# Altium schematic symbol library Diode - Rectifier.SchLib: 777 symbols (part 2 of 4) (continued)
## MURS320T3G (continued)
DIODE GEN PURP 200V 3A SMC; Manufacturer: ON Semiconductor; Type: Standard; Current Reverse Leakage @ Vr: 5uA @ 200V; Reverse Recovery Time (trr): 35ns; Voltage Forward (Vf): 875mV @ 3A; Part Number: MURS320T3G; PartId: 27688; Supplier 1: Digi-Key; Supplier Part Number 1: MURS320T3GOSCT-ND; ComponentLink1Description: Datasheet; ComponentLink1URL: http://www.onsemi.com/pub_link/Collateral/MURS320T3-D.PDF; ComponentLink2Description: Digi-Key Listing; ComponentLink2URL: https://www.digikey.com/product-detail/en/on-semiconductor/MURS320T3G/MURS320T3GOSCT-ND/964579; Junction Operating Temperature: -65C ~ 175C; Price: 0.61; Device Package: DO-214AB, SMC; Voltage DC Reverse (Vr): 200V; Current Rectified: 3A
footprint ST DO214AB SMC
pins: 1, 2

## MURS320TR
designator D?
DIODE GEN PURP 200V 3A SMC; Manufacturer: SMC Diode Solutions; Type: Standard; Current Reverse Leakage @ Vr: 5uA @ 200V; Reverse Recovery Time (trr): 35ns; Voltage Forward (Vf): 900mV @ 3A; Part Number: MURS320TR; PartId: 27814; Supplier 1: Digi-Key; Supplier Part Number 1: 1655-1493-1-ND; ComponentLink1Description: Datasheet; ComponentLink1URL: http://www.smc-diodes.com/propdf/MURS320%20N0162%20REV.A.pdf; ComponentLink2Description: Digi-Key Listing; ComponentLink2URL: https://www.digikey.com/product-detail/en/smc-diode-solutions/MURS320TR/1655-1493-1-ND/6022938; Junction Operating Temperature: -65C ~ 175C; Price: 0.43; Device Package: DO-214AB, SMC; Voltage DC Reverse (Vr): 200V; Current Rectified: 3A
footprint ST DO214AB SMC
pins: 1, 2

## MURS340-E3/57T
designator D?
DIODE GEN PURP 400V 3A DO214AB; Manufacturer: Vishay Semiconductor Diodes Division; Type: Standard; Current Reverse Leakage @ Vr: 10uA @ 400V; Reverse Recovery Time (trr): 75ns; Voltage Forward (Vf): 1.25V @ 3A; Part Number: MURS340-E3/57T; PartId: 27903; Supplier 1: Digi-Key; Supplier Part Number 1: MURS340-E3/57TGICT-ND; ComponentLink1Description: Datasheet; ComponentLink1URL: http://www.vishay.com/docs/88816/murs340.pdf; ComponentLink2Description: Digi-Key Listing; ComponentLink2URL: https://www.digikey.com/product-detail/en/vishay-semiconductor-diodes-division/MURS340-E3-57T/MURS340-E3-57TGICT-ND/1091585; Junction Operating Temperature: -65C ~ 175C; Price: 0.69; Device Package: DO-214AB, SMC; Voltage DC Reverse (Vr): 400V; Current Rectified: 3A
footprint ST DO214AB SMC
pins: 1, 2

## MURS340HE3_A/H
designator D?
DIODE GEN PURP 400V 4A DO214AB; Manufacturer: Vishay Semiconductor Diodes Division; Type: Standard; Current Reverse Leakage @ Vr: 10uA @ 400V; Reverse Recovery Time (trr): 75ns; Voltage Forward (Vf): 1.28V @ 4A; Part Number: MURS340HE3_A/H; PartId: 27787; Supplier 1: Digi-Key; Supplier Part Number 1: MURS340HE3_A/HGICT-ND; ComponentLink1Description: Datasheet; ComponentLink1URL: http://www.vishay.com/docs/88816/murs340.pdf; ComponentLink2Description: Digi-Key Listing; ComponentLink2URL: https://www.digikey.com/product-detail/en/vishay-semiconductor-diodes-division/MURS340HE3_A-H/MURS340HE3_A-HGICT-ND/4743573; Junction Operating Temperature: -65C ~ 175C; Price: 0.69; Device Package: DO-214AB, SMC; Voltage DC Reverse (Vr): 400V; Current Rectified: 4A
footprint ST DO214AB SMC
pins: 1, 2

## MURS340T3G
designator D?
DIODE GEN PURP 400V 3A SMC; Manufacturer: ON Semiconductor; Type: Standard; Current Reverse Leakage @ Vr: 10uA @ 400V; Reverse Recovery Time (trr): 75ns; Voltage Forward (Vf): 1.25V @ 3A; Part Number: MURS340T3G; PartId: 27695; Supplier 1: Digi-Key; Supplier Part Number 1: MURS340T3GOSCT-ND; ComponentLink1Description: Datasheet; ComponentLink1URL: http://www.onsemi.com/pub_link/Collateral/MURS320T3-D.PDF; ComponentLink2Description: Digi-Key Listing; ComponentLink2URL: https://www.digikey.com/product-detail/en/on-semiconductor/MURS340T3G/MURS340T3GOSCT-ND/1139956; Junction Operating Temperature: -65C ~ 175C; Price: 0.65; Device Package: DO-214AB, SMC; Voltage DC Reverse (Vr): 400V; Current Rectified: 3A
footprint ST DO214AB SMC
pins: 1, 2

## MURS360-E3/57T
designator D?
DIODE GEN PURP 600V 3A DO214AB; Manufacturer: Vishay Semiconductor Diodes Division; Type: Standard; Current Reverse Leakage @ Vr: 10uA @ 600V; Reverse Recovery Time (trr): 75ns; Voltage Forward (Vf): 1.25V @ 3A; Part Number: MURS360-E3/57T; PartId: 27904; Supplier 1: Digi-Key; Supplier Part Number 1: MURS360-E3/57TGICT-ND; ComponentLink1Description: Datasheet; ComponentLink1URL: http://www.vishay.com/docs/88816/murs340.pdf; ComponentLink2Description: Digi-Key Listing; ComponentLink2URL: https://www.digikey.com/product-detail/en/vishay-semiconductor-diodes-division/MURS360-E3-57T/MURS360-E3-57TGICT-ND/1091586; Junction Operating Temperature: -65C ~ 175C; Price: 0.69; Device Package: DO-214AB, SMC; Voltage DC Reverse (Vr): 600V; Current Rectified: 3A
footprint ST DO214AB SMC
pins: 1, 2

## MURS480ET3G
designator D?
DIODE GEN PURP 800V 4A SMC; Manufacturer: ON Semiconductor; Type: Standard; Current Reverse Leakage @ Vr: 25uA @ 800V; Reverse Recovery Time (trr): 100ns; Voltage Forward (Vf): 1.85V @ 4A; Part Number: MURS480ET3G; PartId: 27708; Supplier 1: Digi-Key; Supplier Part Number 1: MURS480ET3GOSCT-ND; ComponentLink1Description: Datasheet; ComponentLink1URL: http://www.onsemi.com/pub_link/Collateral/MURS480E.PDF; ComponentLink2Description: Digi-Key Listing; ComponentLink2URL: https://www.digikey.com/product-detail/en/on-semiconductor/MURS480ET3G/MURS480ET3GOSCT-ND/3462382; Junction Operating Temperature: -65C ~ 175C; Price: 0.98; Device Package: DO-214AB, SMC; Voltage DC Reverse (Vr): 800V; Current Rectified: 4A
footprint ST DO214AB SMC
pins: 1, 2

## NHP220SFT3G
designator D?
IGBT 200V 2A SOD123FL; Manufacturer: ON Semiconductor; Type: Standard; Current Reverse Leakage @ Vr: 500nA @ 200V; Reverse Recovery Time (trr): 50ns; Voltage Forward (Vf): 1.05V @ 2A; Part Number: NHP220SFT3G; PartId: 29162; Supplier 1: Digi-Key; Supplier Part Number 1: NHP220SFT3GOSCT-ND; ComponentLink1Description: Datasheet; ComponentLink1URL: http://www.onsemi.com/pub_link/Collateral/NHP220SF-D.PDF; ComponentLink2Description: Digi-Key Listing; ComponentLink2URL: https://www.digikey.com/product-detail/en/on-semiconductor/NHP220SFT3G/NHP220SFT3GOSCT-ND/5801747; Junction Operating Temperature: -65C ~ 175C; Price: 0.39; Device Package: SOD-123F; Voltage DC Reverse (Vr): 200V; Current Rectified: 2A
footprint SOD123F
pins: 1, 2

## NRVB1H100SFT3G
designator D?
DIODE SCHOTTKY 100V 1A SOD123; Manufacturer: ON Semiconductor; Current Reverse Leakage @ Vr: 40uA @ 100V; Voltage Forward (Vf): 760mV @ 1A; Part Number: NRVB1H100SFT3G; PartId: 29319; Supplier 1: Digi-Key; Supplier Part Number 1: NRVB1H100SFT3GOSCT-ND; ComponentLink1Description: Datasheet; ComponentLink1URL: http://www.onsemi.com/pub_link/Collateral/MBR1H100SF-D.PDF; ComponentLink2Description: Digi-Key Listing; ComponentLink2URL: https://www.digikey.com/product-detail/en/on-semiconductor/NRVB1H100SFT3G/NRVB1H100SFT3GOSCT-ND/5969072; Junction Operating Temperature: -65C ~ 175C; Price: 0.93; Type: Schottky; Device Package: SOD-123F; Voltage DC Reverse (Vr): 100V; Current Rectified: 1A
footprint SOD123F
pins: 1, 2

## NRVB130T1G
designator D?
DIODE SCHOTTKY 30V 1A SOD123; Manufacturer: ON Semiconductor; Current Reverse Leakage @ Vr: 60uA @ 30V; Voltage Forward (Vf): 470mV @ 1A; Part Number: NRVB130T1G; PartId: 29437; Supplier 1: Digi-Key; Supplier Part Number 1: NRVB130T1GOSCT-ND; ComponentLink1Description: Datasheet; ComponentLink1URL: http://www.onsemi.com/pub_link/Collateral/MBR130T1-D.PDF; ComponentLink2Description: Digi-Key Listing; ComponentLink2URL: https://www.digikey.com/product-detail/en/on-semiconductor/NRVB130T1G/NRVB130T1GOSCT-ND/5213347; Junction Operating Temperature: -55C ~ 150C; Price: 0.43; Type: Schottky; Device Package: SOD-123; Voltage DC Reverse (Vr): 30V; Current Rectified: 1A
footprint SOD-123
pins: 1, 2

## NRVB140SFT1G
designator D?
DIODE SCHOTTKY 40V 1A SOD123FL; Manufacturer: ON Semiconductor; Current Reverse Leakage @ Vr: 500uA @ 40V; Voltage Forward (Vf): 550mV @ 1A; Part Number: NRVB140SFT1G; PartId: 29247; Supplier 1: Digi-Key; Supplier Part Number 1: NRVB140SFT1GOSCT-ND; ComponentLink1Description: Datasheet; ComponentLink1URL: http://www.onsemi.com/pub_link/Collateral/MBR140SFT1-D.PDF; ComponentLink2Description: Digi-Key Listing; ComponentLink2URL: https://www.digikey.com/product-detail/en/on-semiconductor/NRVB140SFT1G/NRVB140SFT1GOSCT-ND/5213348; Junction Operating Temperature: -55C ~ 125C; Price: 0.5; Type: Schottky; Device Package: SOD-123F; Voltage DC Reverse (Vr): 40V; Current Rectified: 1A
footprint SOD123F
pins: 1, 2

## NRVB0540T1G
designator D?
DIODE SCHOTTKY 40V 500MA SOD123; Manufacturer: ON Semiconductor; Current Reverse Leakage @ Vr: 20uA @ 40V; Voltage Forward (Vf): 510mV @ 500mA; Part Number: NRVB0540T1G; PartId: 29396; Supplier 1: Digi-Key; Supplier Part Number 1: NRVB0540T1GOSCT-ND; ComponentLink1Description: Datasheet; ComponentLink1URL: http://www.onsemi.com/pub_link/Collateral/MBR0540T1-D.PDF; ComponentLink2Description: Digi-Key Listing; ComponentLink2URL: https://www.digikey.com/product-detail/en/on-semiconductor/NRVB0540T1G/NRVB0540T1GOSCT-ND/5213346; Junction Operating Temperature: -55C ~ 150C; Price: 0.39; Type: Schottky; Device Package: SOD-123; Voltage DC Reverse (Vr): 40V; Current Rectified: 500mA
footprint SOD-123
pins: 1, 2

## NRVBS360T3G
designator D?
DIODE SCHOTTKY 60V 3A SMC; Manufacturer: ON Semiconductor; Current Reverse Leakage @ Vr: 30uA @ 60V; Voltage Forward (Vf): 630mV @ 3A; Part Number: NRVBS360T3G; PartId: 27705; Supplier 1: Digi-Key; Supplier Part Number 1: NRVBS360T3GOSCT-ND; ComponentLink1Description: Datasheet; ComponentLink1URL: http://www.onsemi.com/pub/Collateral/MBRS360T3-D.PDF; ComponentLink2Description: Digi-Key Listing; ComponentLink2URL: https://www.digikey.com/product-detail/en/on-semiconductor/NRVBS360T3G/NRVBS360T3GOSCT-ND/4331852; Junction Operating Temperature: -65C ~ 175C; Price: 0.92; Type: Schottky; Device Package: DO-214AB, SMC; Voltage DC Reverse (Vr): 60V; Current Rectified: 3A
footprint ST DO214AB SMC
pins: 1, 2

## NRVBS540T3G
designator D?
DIODE SCHOTTKY 40V 5A SMC; Manufacturer: ON Semiconductor; Current Reverse Leakage @ Vr: 300uA @ 40V; Voltage Forward (Vf): 500mV @ 5A; Part Number: NRVBS540T3G; PartId: 27907; Supplier 1: Digi-Key; Supplier Part Number 1: NRVBS540T3GOSCT-ND; ComponentLink1Description: Datasheet; ComponentLink1URL: http://www.onsemi.com/pub/Collateral/MBRS540T3-D.PDF; ComponentLink2Description: Digi-Key Listing; ComponentLink2URL: https://www.digikey.com/product-detail/en/on-semiconductor/NRVBS540T3G/NRVBS540T3GOSCT-ND/5969094; Junction Operating Temperature: -65C ~ 150C; Price: 0.76; Type: Schottky; Device Package: DO-214AB, SMC; Voltage DC Reverse (Vr): 40V; Current Rectified: 5A
footprint ST DO214AB SMC
pins: 1, 2

## NRVBS3100T3G
designator D?
DIODE SCHOTTKY 100V 3A SMC; Manufacturer: ON Semiconductor; Current Reverse Leakage @ Vr: 50uA @ 100V; Voltage Forward (Vf): 790mV @ 3A; Part Number: NRVBS3100T3G; PartId: 27871; Supplier 1: Digi-Key; Supplier Part Number 1: NRVBS3100T3GOSCT-ND; ComponentLink1Description: Datasheet; ComponentLink1URL: http://www.onsemi.com/pub/Collateral/MBRS3100T3-D.PDF; ComponentLink2Description: Digi-Key Listing; ComponentLink2URL: https://www.digikey.com/product-detail/en/on-semiconductor/NRVBS3100T3G/NRVBS3100T3GOSCT-ND/3487455; Junction Operating Temperature: -65C ~ 175C; Price: 0.9; Type: Schottky; Device Package: DO-214AB, SMC; Voltage DC Reverse (Vr): 100V; Current Rectified: 3A
footprint ST DO214AB SMC
pins: 1, 2

## NRVBS3201T3G
designator D?
DIODE SCHOTTKY 200V 3A SMC; Manufacturer: ON Semiconductor; Current Reverse Leakage @ Vr: 1mA @ 200V; Reverse Recovery Time (trr): 35ns; Voltage Forward (Vf): 840mV @ 3A; Part Number: NRVBS3201T3G; PartId: 27873; Supplier 1: Digi-Key; Supplier Part Number 1: NRVBS3201T3GOSCT-ND; ComponentLink1Description: Datasheet; ComponentLink1URL: http://www.onsemi.com/pub_link/Collateral/MBRS3201T3-D.PDF; ComponentLink2Description: Digi-Key Listing; ComponentLink2URL: https://www.digikey.com/product-detail/en/on-semiconductor/NRVBS3201T3G/NRVBS3201T3GOSCT-ND/5969091; Junction Operating Temperature: -55C ~ 150C; Price: 0.92; Type: Schottky; Device Package: DO-214AB, SMC; Voltage DC Reverse (Vr): 200V; Current Rectified: 3A
footprint ST DO214AB SMC
pins: 1, 2

## NRVTS245ESFT1G
designator D?
DIODE SCHOTTKY 45V 2A SOD123FL; Manufacturer: ON Semiconductor; Current Reverse Leakage @ Vr: 75uA @ 45V; Voltage Forward (Vf): 650mV @ 2A; Part Number: NRVTS245ESFT1G; PartId: 29336; Supplier 1: Digi-Key; Supplier Part Number 1: NRVTS245ESFT1GOSCT-ND; ComponentLink1Description: Datasheet; ComponentLink1URL: http://www.onsemi.com/pub/Collateral/NRVTS245ESF-D.PDF; ComponentLink2Description: Digi-Key Listing; ComponentLink2URL: https://www.digikey.com/product-detail/en/on-semiconductor/NRVTS245ESFT1G/NRVTS245ESFT1GOSCT-ND/5131387; Junction Operating Temperature: -65C ~ 175C; Price: 0.34; Type: Schottky; Device Package: SOD-123F; Voltage DC Reverse (Vr): 45V; Current Rectified: 2A
footprint SOD123F
pins: 1, 2

## NRVTS260ESFT1G
designator D?
DIODE SCHOTTKY 60V 2A SOD123FL; Manufacturer: ON Semiconductor; Current Reverse Leakage @ Vr: 12uA @ 60V; Voltage Forward (Vf): 650mV @ 2A; Part Number: NRVTS260ESFT1G; PartId: 29186; Supplier 1: Digi-Key; Supplier Part Number 1: NRVTS260ESFT1GOSCT-ND; ComponentLink1Description: Datasheet; ComponentLink1URL: http://www.onsemi.com/pub/Collateral/NTS260ESF-D.PDF; ComponentLink2Description: Digi-Key Listing; ComponentLink2URL: https://www.digikey.com/product-detail/en/on-semiconductor/NRVTS260ESFT1G/NRVTS260ESFT1GOSCT-ND/5131388; Junction Operating Temperature: -65C ~ 175C; Price: 0.35; Type: Schottky; Device Package: SOD-123F; Voltage DC Reverse (Vr): 60V; Current Rectified: 2A
footprint SOD123F
pins: 1, 2

## NSD914XV2T1G
designator D?
DIODE GEN PURP 100V 200MA SOD523; Manufacturer: ON Semiconductor; Type: Surface Mount; Current Reverse Leakage @ Vr: 5uA @ 75V; Reverse Recovery Time (trr): 4ns; Current Rectified: 200mA (DC); Voltage Forward (Vf): 1V @ 10mA; Part Number: NSD914XV2T1G; PartId: 7152; Supplier 1: Digi-Key; Supplier Part Number 1: NSD914XV2T1GOSTR-ND; ComponentLink1Description: Datasheet; ComponentLink1URL: http://www.onsemi.com/pub_link/Collateral/NSD914XV2T1-D.PDF; ComponentLink2Description: Digi-Key Listing; ComponentLink2URL: http://www.digikey.ca/product-detail/en/NSD914XV2T1G/NSD914XV2T1GOSTR-ND/893857; Junction Operating Temperature: -55C ~ 150C; Price: 0.0841; Device Package: SC-79, SOD-523; Voltage DC Reverse (Vr): 100V
footprint SOD523F
pins: 1, 2

## NSR0520V2T1G
designator D?
DIODE SCHOTTKY 20V 500MA SOD523; Manufacturer: ON Semiconductor; Type: Surface Mount; Current Reverse Leakage @ Vr: 75uA @ 20V; Reverse Recovery Time (trr): 12ns; Current Rectified: 500mA (DC); Voltage Forward (Vf): 480mV @ 500mA; Part Number: NSR0520V2T1G; PartId: 7150; Supplier 1: Digi-Key; Supplier Part Number 1: NSR0520V2T1GOSTR-ND; ComponentLink1Description: Datasheet; ComponentLink1URL: http://www.onsemi.com/pub_link/Collateral/NSR0520V2T1-D.PDF; ComponentLink2Description: Digi-Key Listing; ComponentLink2URL: http://www.digikey.ca/product-detail/en/NSR0520V2T1G/NSR0520V2T1GOSTR-ND/1961244; Junction Operating Temperature: -55C ~ 125C; Price: 0.1156; Device Package: SC-79, SOD-523; Voltage DC Reverse (Vr): 20V
footprint SOD523F
pins: 1, 2

## NTS245SFT1G
designator D?
DIODE SCHOTTKY 45V 2A SOD123FL; Manufacturer: ON Semiconductor; Current Reverse Leakage @ Vr: 120uA @ 45V; Voltage Forward (Vf): 630mV @ 2A; Part Number: NTS245SFT1G; PartId: 29323; Supplier 1: Digi-Key; Supplier Part Number 1: NTS245SFT1GOSCT-ND; ComponentLink1Description: Datasheet; ComponentLink1URL: http://www.onsemi.com/pub/Collateral/NTS245SF-D.PDF; ComponentLink2Description: Digi-Key Listing; ComponentLink2URL: https://www.digikey.com/product-detail/en/on-semiconductor/NTS245SFT1G/NTS245SFT1GOSCT-ND/5131394; Junction Operating Temperature: -65C ~ 150C; Price: 0.38; Type: Schottky; Device Package: SOD-123F; Voltage DC Reverse (Vr): 45V; Current Rectified: 2A
footprint SOD123F
pins: 1, 2

## NTS260SFT1G
designator D?
DIODE SCHOTTKY 60V 2A SOD123FL; Manufacturer: ON Semiconductor; Current Reverse Leakage @ Vr: 50uA @ 45V; Voltage Forward (Vf): 650mV @ 2A; Part Number: NTS260SFT1G; PartId: 29191; Supplier 1: Digi-Key; Supplier Part Number 1: NTS260SFT1GOSCT-ND; ComponentLink1Description: Datasheet; ComponentLink1URL: http://www.onsemi.com/pub/Collateral/NTS260SF-D.PDF; ComponentLink2Description: Digi-Key Listing; ComponentLink2URL: https://www.digikey.com/product-detail/en/on-semiconductor/NTS260SFT1G/NTS260SFT1GOSCT-ND/5131395; Junction Operating Temperature: -65C ~ 150C; Price: 0.42; Type: Schottky; Device Package: SOD-123F; Voltage DC Reverse (Vr): 60V; Current Rectified: 2A
footprint SOD123F
pins: 1, 2

## PMEG1020EH,115
designator D?
DIODE SCHOTTKY 10V 2A SOD123F; Manufacturer: NXP USA Inc.; Current Reverse Leakage @ Vr: 3mA @ 10V; Current Rectified: 2A (DC); Voltage Forward (Vf): 460mV @ 2A; Part Number: PMEG1020EH,115; PartId: 29268; Supplier 1: Digi-Key; Supplier Part Number 1: 568-4105-1-ND; ComponentLink1Description: Datasheet; ComponentLink1URL: http://www.nxp.com/documents/data_sheet/PMEG1020EH_EJ.pdf; ComponentLink2Description: Digi-Key Listing; ComponentLink2URL: https://www.digikey.com/product-detail/en/nxp-usa-inc/PMEG1020EH,115/568-4105-1-ND/1589920; Junction Operating Temperature: 150C (Max); Price: 0.39; Type: Schottky; Device Package: SOD-123F; Voltage DC Reverse (Vr): 10V
footprint SOD123F
pins: 1, 2

## PMEG1030EH,115
designator D?
DIODE SCHOTTKY 10V 3A SOD123F; Manufacturer: NXP USA Inc.; Current Reverse Leakage @ Vr: 3mA @ 10V; Current Rectified: 3A (DC); Voltage Forward (Vf): 530mV @ 3A; Part Number: PMEG1030EH,115; PartId: 29222; Supplier 1: Digi-Key; Supplier Part Number 1: 568-4107-1-ND; ComponentLink1Description: Datasheet; ComponentLink1URL: http://www.nxp.com/documents/data_sheet/PMEG1030EH_EJ.pdf; ComponentLink2Description: Digi-Key Listing; ComponentLink2URL: https://www.digikey.com/product-detail/en/nxp-usa-inc/PMEG1030EH,115/568-4107-1-ND/1589922; Junction Operating Temperature: 150C (Max); Price: 0.48; Type: Schottky; Device Package: SOD-123F; Voltage DC Reverse (Vr): 10V
footprint SOD123F
pins: 1, 2

## PMEG2005EH,115
designator D?
DIODE SCHOTTKY 20V 500MA SOD123F; Manufacturer: NXP USA Inc.; Current Reverse Leakage @ Vr: 200uA @ 20V; Current Rectified: 500mA (DC); Voltage Forward (Vf): 390mV @ 500mA; Part Number: PMEG2005EH,115; PartId: 29204; Supplier 1: Digi-Key; Supplier Part Number 1: 568-4109-1-ND; ComponentLink1Description: Datasheet; ComponentLink1URL: http://www.nxp.com/documents/data_sheet/PMEGXX05EH_EJ_SER.pdf; ComponentLink2Description: Digi-Key Listing; ComponentLink2URL: https://www.digikey.com/product-detail/en/nxp-usa-inc/PMEG2005EH,115/568-4109-1-ND/1589924; Junction Operating Temperature: 150C (Max); Price: 0.44; Type: Schottky; Device Package: SOD-123F; Voltage DC Reverse (Vr): 20V
footprint SOD123F
pins: 1, 2

## PMEG2010AEH,115
designator D?
DIODE SCHOTTKY 20V 1A SOD123F; Manufacturer: NXP Semiconductors; Type: Surface Mount; Current Reverse Leakage @ Vr: 200uA @ 20V; Current Rectified: 1A (DC); Voltage Forward (Vf): 430mV @ 1A; Part Number: PMEG2010AEH,115; PartId: 7140; Supplier 1: Digi-Key; Supplier Part Number 1: 568-4112-2-ND; ComponentLink1Description: Datasheet; ComponentLink1URL: http://www.nxp.com/documents/data_sheet/PMEG2010AEH_PMEG2010AET.pdf; ComponentLink2Description: Digi-Key Listing; ComponentLink2URL: http://www.digikey.ca/product-detail/en/PMEG2010AEH,115/568-4112-2-ND/1157670; Junction Operating Temperature: 150C (Max); Price: 0.1507; Device Package: SOD-123F; Reverse Recovery Time (trr): -; Voltage DC Reverse (Vr): 20V
footprint SOD123F
pins: 1, 2

## PMEG2010EH,115
designator D?
DIODE SCHOTTKY 20V 1A SOD123F; Manufacturer: NXP USA Inc.; Current Reverse Leakage @ Vr: 200uA @ 20V; Current Rectified: 1A (DC); Voltage Forward (Vf): 500mV @ 1A; Part Number: PMEG2010EH,115; PartId: 29234; Supplier 1: Digi-Key; Supplier Part Number 1: 568-4114-1-ND; ComponentLink1Description: Datasheet; ComponentLink1URL: http://www.nxp.com/documents/data_sheet/PMEG2010EH_EJ_ET.pdf; ComponentLink2Description: Digi-Key Listing; ComponentLink2URL: https://www.digikey.com/product-detail/en/nxp-usa-inc/PMEG2010EH,115/568-4114-1-ND/1589929; Junction Operating Temperature: 150C (Max); Price: 0.38; Type: Schottky; Device Package: SOD-123F; Voltage DC Reverse (Vr): 20V
footprint SOD123F
pins: 1, 2

## PMEG2015EH,115
designator D?
DIODE SCHOTTKY 20V 1.5A SOD123F; Manufacturer: NXP USA Inc.; Current Reverse Leakage @ Vr: 70uA @ 20V; Current Rectified: 1.5A (DC); Voltage Forward (Vf): 660mV @ 1.5A; Part Number: PMEG2015EH,115; PartId: 29276; Supplier 1: Digi-Key; Supplier Part Number 1: 568-4116-1-ND; ComponentLink1Description: Datasheet; ComponentLink1URL: http://www.nxp.com/documents/data_sheet/PMEG2015EH_EJ.pdf; ComponentLink2Description: Digi-Key Listing; ComponentLink2URL: https://www.digikey.com/product-detail/en/nxp-usa-inc/PMEG2015EH,115/568-4116-1-ND/1589931; Junction Operating Temperature: 150C (Max); Price: 0.41; Type: Schottky; Device Package: SOD-123F; Voltage DC Reverse (Vr): 20V
footprint SOD123F
pins: 1, 2

## PMEG2020EH,115
designator D?
DIODE SCHOTTKY 20V 2A SOD123F; Manufacturer: NXP USA Inc.; Current Reverse Leakage @ Vr: 200uA @ 20V; Current Rectified: 2A (DC); Voltage Forward (Vf): 525mV @ 2A; Part Number: PMEG2020EH,115; PartId: 29277; Supplier 1: Digi-Key; Supplier Part Number 1: 568-4118-1-ND; ComponentLink1Description: Datasheet; ComponentLink1URL: http://www.nxp.com/documents/data_sheet/PMEG2020EH_EJ.pdf; ComponentLink2Description: Digi-Key Listing; ComponentLink2URL: https://www.digikey.com/product-detail/en/nxp-usa-inc/PMEG2020EH,115/568-4118-1-ND/1589933; Junction Operating Temperature: 150C (Max); Price: 0.41; Type: Schottky; Device Package: SOD-123F; Voltage DC Reverse (Vr): 20V
footprint SOD123F
pins: 1, 2

## PMEG3002EJ,115
designator D?
DIODE SCHOTTKY 30V 200MA SOD323F; Manufacturer: NXP Semiconductors; Type: Surface Mount; Current Reverse Leakage @ Vr: 40uA @ 30V; Reverse Recovery Time (trr): 5ns; Voltage Forward (Vf): 480mV @ 200mA; Part Number: PMEG3002EJ,115; PartId: 7141; Supplier 1: Digi-Key; Supplier Part Number 1: 568-7394-2-ND; ComponentLink1Description: Datasheet; ComponentLink1URL: http://www.nxp.com/documents/data_sheet/PMEG3002EJ.pdf; ComponentLink2Description: Digi-Key Listing; ComponentLink2URL: http://www.digikey.ca/product-detail/en/PMEG3002EJ,115/568-7394-2-ND/2119862; Junction Operating Temperature: 150C (Max); Price: 0.1204; Device Package: SC-90, SOD-323F; Voltage DC Reverse (Vr): 30V; Current Rectified: 200mA
footprint SOD323F
pins: 1, 2

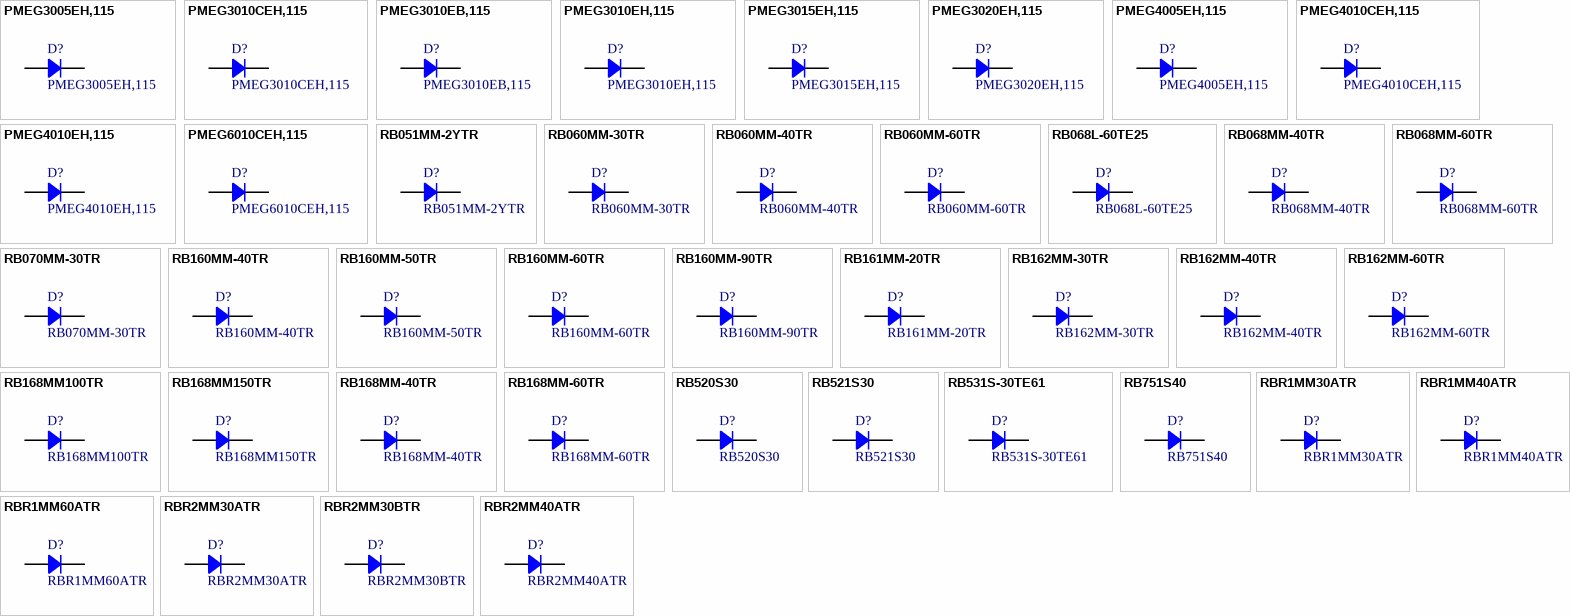
[diagram p10: symbols PMEG3005EH,115 to RBR2MM40ATR]

## PMEG3005EH,115
designator D?
DIODE SCHOTTKY 30V 500MA SOD123F; Manufacturer: NXP USA Inc.; Current Reverse Leakage @ Vr: 150uA @ 30V; Current Rectified: 500mA (DC); Voltage Forward (Vf): 430mV @ 500mA; Part Number: PMEG3005EH,115; PartId: 29205; Supplier 1: Digi-Key; Supplier Part Number 1: 568-4121-1-ND; ComponentLink1Description: Datasheet; ComponentLink1URL: http://www.nxp.com/documents/data_sheet/PMEGXX05EH_EJ_SER.pdf; ComponentLink2Description: Digi-Key Listing; ComponentLink2URL: https://www.digikey.com/product-detail/en/nxp-usa-inc/PMEG3005EH,115/568-4121-1-ND/1589936; Junction Operating Temperature: 150C (Max); Price: 0.44; Type: Schottky; Device Package: SOD-123F; Voltage DC Reverse (Vr): 30V
footprint SOD123F
pins: 1, 2

## PMEG3010CEH,115
designator D?
DIODE SCHOTTKY 30V 1A SOD123F; Manufacturer: NXP USA Inc.; Current Reverse Leakage @ Vr: 50uA @ 30V; Current Rectified: 1A (DC); Voltage Forward (Vf): 520mV @ 1A; Part Number: PMEG3010CEH,115; PartId: 29269; Supplier 1: Digi-Key; Supplier Part Number 1: 568-7399-1-ND; ComponentLink1Description: Datasheet; ComponentLink1URL: http://www.nxp.com/documents/data_sheet/PMEG3010CEH_PMEG3010CEJ.pdf; ComponentLink2Description: Digi-Key Listing; ComponentLink2URL: https://www.digikey.com/product-detail/en/nxp-usa-inc/PMEG3010CEH,115/568-7399-1-ND/2697414; Junction Operating Temperature: 150C (Max); Price: 0.39; Type: Schottky; Device Package: SOD-123F; Voltage DC Reverse (Vr): 30V
footprint SOD123F
pins: 1, 2

## PMEG3010EB,115
designator D?
DIODE SCHOTTKY 30V 1A SOD523; Manufacturer: NXP Semiconductors; Type: Surface Mount; Current Reverse Leakage @ Vr: 500uA @ 30V; Current Rectified: 1A (DC); Voltage Forward (Vf): 680mV @ 1A; Part Number: PMEG3010EB,115; PartId: 7146; Supplier 1: Digi-Key; Supplier Part Number 1: 568-7400-2-ND; ComponentLink1Description: Datasheet; ComponentLink1URL: http://www.nxp.com/documents/data_sheet/PMEG3010EB.pdf; ComponentLink2Description: Digi-Key Listing; ComponentLink2URL: http://www.digikey.ca/product-detail/en/PMEG3010EB,115/568-7400-2-ND/1693021; Junction Operating Temperature: 150C (Max); Price: 0.1547; Device Package: SC-79, SOD-523; Reverse Recovery Time (trr): -; Voltage DC Reverse (Vr): 30V
footprint SOD523F
pins: 1, 2

## PMEG3010EH,115
designator D?
DIODE SCHOTTKY 30V 1A SOD123F; Manufacturer: NXP USA Inc.; Current Reverse Leakage @ Vr: 150uA @ 30V; Current Rectified: 1A (DC); Voltage Forward (Vf): 560mV @ 1A; Part Number: PMEG3010EH,115; PartId: 29292; Supplier 1: Digi-Key; Supplier Part Number 1: 568-4125-1-ND; ComponentLink1Description: Datasheet; ComponentLink1URL: http://www.nxp.com/documents/data_sheet/PMEG3010EH_EJ_ET.pdf; ComponentLink2Description: Digi-Key Listing; ComponentLink2URL: https://www.digikey.com/product-detail/en/nxp-usa-inc/PMEG3010EH,115/568-4125-1-ND/1589940; Junction Operating Temperature: 150C (Max); Price: 0.48; Type: Schottky; Device Package: SOD-123F; Voltage DC Reverse (Vr): 30V
footprint SOD123F
pins: 1, 2

## PMEG3015EH,115
designator D?
DIODE SCHOTTKY 30V 1.5A SOD123F; Manufacturer: NXP USA Inc.; Current Reverse Leakage @ Vr: 1mA @ 30V; Current Rectified: 1.5A (DC); Voltage Forward (Vf): 550mV @ 1.5A; Part Number: PMEG3015EH,115; PartId: 29171; Supplier 1: Digi-Key; Supplier Part Number 1: 568-4127-1-ND; ComponentLink1Description: Datasheet; ComponentLink1URL: http://www.nxp.com/documents/data_sheet/PMEG3015EH_EJ.pdf; ComponentLink2Description: Digi-Key Listing; ComponentLink2URL: https://www.digikey.com/product-detail/en/nxp-usa-inc/PMEG3015EH,115/568-4127-1-ND/1589942; Junction Operating Temperature: 150C (Max); Price: 0.39; Type: Schottky; Device Package: SOD-123F; Voltage DC Reverse (Vr): 30V
footprint SOD123F
pins: 1, 2

## PMEG3020EH,115
designator D?
DIODE SCHOTTKY 30V 2A SOD123F; Manufacturer: NXP USA Inc.; Current Reverse Leakage @ Vr: 1mA @ 30V; Current Rectified: 2A (DC); Voltage Forward (Vf): 620mV @ 2A; Part Number: PMEG3020EH,115; PartId: 29218; Supplier 1: Digi-Key; Supplier Part Number 1: 568-4129-1-ND; ComponentLink1Description: Datasheet; ComponentLink1URL: http://www.nxp.com/documents/data_sheet/PMEG3020EH_EJ.pdf; ComponentLink2Description: Digi-Key Listing; ComponentLink2URL: https://www.digikey.com/product-detail/en/nxp-usa-inc/PMEG3020EH,115/568-4129-1-ND/1589944; Junction Operating Temperature: 150C (Max); Price: 0.41; Type: Schottky; Device Package: SOD-123F; Voltage DC Reverse (Vr): 30V
footprint SOD123F
pins: 1, 2

## PMEG4005EH,115
designator D?
DIODE SCHOTTKY 40V 500MA SOD123F; Manufacturer: NXP USA Inc.; Current Reverse Leakage @ Vr: 100uA @ 40V; Current Rectified: 500mA (DC); Voltage Forward (Vf): 470mV @ 500mA; Part Number: PMEG4005EH,115; PartId: 29285; Supplier 1: Digi-Key; Supplier Part Number 1: 568-4132-1-ND; ComponentLink1Description: Datasheet; ComponentLink1URL: http://www.nxp.com/documents/data_sheet/PMEGXX05EH_EJ_SER.pdf; ComponentLink2Description: Digi-Key Listing; ComponentLink2URL: https://www.digikey.com/product-detail/en/nxp-usa-inc/PMEG4005EH,115/568-4132-1-ND/1589947; Junction Operating Temperature: 150C (Max); Price: 0.44; Type: Schottky; Device Package: SOD-123F; Voltage DC Reverse (Vr): 40V
footprint SOD123F
pins: 1, 2

## PMEG4010CEH,115
designator D?
DIODE SCHOTTKY 40V 1A SOD123F; Manufacturer: NXP USA Inc.; Current Reverse Leakage @ Vr: 50uA @ 40V; Current Rectified: 1A (DC); Voltage Forward (Vf): 570mV @ 1A; Part Number: PMEG4010CEH,115; PartId: 29213; Supplier 1: Digi-Key; Supplier Part Number 1: 568-4102-1-ND; ComponentLink1Description: Datasheet; ComponentLink1URL: http://www.nxp.com/documents/data_sheet/PMEG4010CEH_PMEG4010CEJ.pdf; ComponentLink2Description: Digi-Key Listing; ComponentLink2URL: https://www.digikey.com/product-detail/en/nxp-usa-inc/PMEG4010CEH,115/568-4102-1-ND/1589915; Junction Operating Temperature: 150C (Max); Price: 0.39; Type: Schottky; Device Package: SOD-123F; Voltage DC Reverse (Vr): 40V
footprint SOD123F
pins: 1, 2

## PMEG4010EH,115
designator D?
DIODE SCHOTTKY 40V 1A SOD123F; Manufacturer: NXP USA Inc.; Current Reverse Leakage @ Vr: 100uA @ 40V; Current Rectified: 1A (DC); Voltage Forward (Vf): 640mV @ 1A; Part Number: PMEG4010EH,115; PartId: 29293; Supplier 1: Digi-Key; Supplier Part Number 1: 568-4136-1-ND; ComponentLink1Description: Datasheet; ComponentLink1URL: http://www.nxp.com/documents/data_sheet/PMEG4010EH_EJ_ET.pdf; ComponentLink2Description: Digi-Key Listing; ComponentLink2URL: https://www.digikey.com/product-detail/en/nxp-usa-inc/PMEG4010EH,115/568-4136-1-ND/1589951; Junction Operating Temperature: 150C (Max); Price: 0.48; Type: Schottky; Device Package: SOD-123F; Voltage DC Reverse (Vr): 40V
footprint SOD123F
pins: 1, 2

## PMEG6010CEH,115
designator D?
DIODE SCHOTTKY 60V 1A SOD123F; Manufacturer: NXP USA Inc.; Current Reverse Leakage @ Vr: 50uA @ 60V; Current Rectified: 1A (DC); Voltage Forward (Vf): 660mV @ 1A; Part Number: PMEG6010CEH,115; PartId: 29169; Supplier 1: Digi-Key; Supplier Part Number 1: 568-4104-1-ND; ComponentLink1Description: Datasheet; ComponentLink1URL: http://www.nxp.com/documents/data_sheet/PMEG6010CEH_PMEG6010CEJ.pdf; ComponentLink2Description: Digi-Key Listing; ComponentLink2URL: https://www.digikey.com/product-detail/en/nxp-usa-inc/PMEG6010CEH,115/568-4104-1-ND/1589917; Junction Operating Temperature: 150C (Max); Price: 0.38; Type: Schottky; Device Package: SOD-123F; Voltage DC Reverse (Vr): 60V
footprint SOD123F
pins: 1, 2

## RB051MM-2YTR
designator D?
DIODE SCHOTTKY 20V 3A PMDU; Manufacturer: Rohm Semiconductor; Current Reverse Leakage @ Vr: 900uA @ 20V; Voltage Forward (Vf): 460mV @ 3A; Part Number: RB051MM-2YTR; PartId: 29249; Supplier 1: Digi-Key; Supplier Part Number 1: RB051MM-2YCT-ND; ComponentLink1Description: Datasheet; ComponentLink1URL: http://rohmfs.rohm.com/en/products/databook/datasheet/discrete/diode/schottky_barrier/rb051mm-2y.pdf; ComponentLink2Description: Digi-Key Listing; ComponentLink2URL: https://www.digikey.com/product-detail/en/rohm-semiconductor/RB051MM-2YTR/RB051MM-2YCT-ND/5813351; Junction Operating Temperature: 125C (Max); Price: 0.53; Type: Schottky; Device Package: SOD-123F; Voltage DC Reverse (Vr): 20V; Current Rectified: 3A
footprint SOD123F
pins: 1, 2

## RB060MM-30TR
designator D?
DIODE SCHOTTKY 30V 2A PMDU; Manufacturer: Rohm Semiconductor; Current Reverse Leakage @ Vr: 50uA @ 30V; Voltage Forward (Vf): 490mV @ 2A; Part Number: RB060MM-30TR; PartId: 29296; Supplier 1: Digi-Key; Supplier Part Number 1: RB060MM-30CT-ND; ComponentLink1Description: Datasheet; ComponentLink1URL: http://rohmfs.rohm.com/en/products/databook/datasheet/discrete/diode/schottky_barrier/rb060mm-30.pdf; ComponentLink2Description: Digi-Key Listing; ComponentLink2URL: https://www.digikey.com/product-detail/en/rohm-semiconductor/RB060MM-30TR/RB060MM-30CT-ND/5001874; Junction Operating Temperature: 150C (Max); Price: 0.5; Type: Schottky; Device Package: SOD-123F; Voltage DC Reverse (Vr): 30V; Current Rectified: 2A
footprint SOD123F
pins: 1, 2

## RB060MM-40TR
designator D?
DIODE SCHOTTKY 40V 2A PMDU; Manufacturer: Rohm Semiconductor; Current Reverse Leakage @ Vr: 500uA @ 40V; Voltage Forward (Vf): 560mV @ 2A; Part Number: RB060MM-40TR; PartId: 29248; Supplier 1: Digi-Key; Supplier Part Number 1: RB060MM-40CT-ND; ComponentLink1Description: Datasheet; ComponentLink1URL: http://rohmfs.rohm.com/en/products/databook/datasheet/discrete/diode/schottky_barrier/rb060mm-40.pdf; ComponentLink2Description: Digi-Key Listing; ComponentLink2URL: https://www.digikey.com/product-detail/en/rohm-semiconductor/RB060MM-40TR/RB060MM-40CT-ND/5813357; Junction Operating Temperature: 150C (Max); Price: 0.45; Type: Schottky; Device Package: SOD-123F; Voltage DC Reverse (Vr): 40V; Current Rectified: 2A
footprint SOD123F
pins: 1, 2

## RB060MM-60TR
designator D?
DIODE SCHOTTKY 60V 2A PMDU; Manufacturer: Rohm Semiconductor; Current Reverse Leakage @ Vr: 50uA @ 60V; Voltage Forward (Vf): 610mV @ 2A; Part Number: RB060MM-60TR; PartId: 29696; Supplier 1: Digi-Key; Supplier Part Number 1: RB060MM-60CT-ND; ComponentLink1Description: Datasheet; ComponentLink1URL: http://rohmfs.rohm.com/en/products/databook/datasheet/discrete/diode/schottky_barrier/rb060mm-60.pdf; ComponentLink2Description: Digi-Key Listing; ComponentLink2URL: https://www.digikey.com/product-detail/en/rohm-semiconductor/RB060MM-60TR/RB060MM-60CT-ND/5001875; Junction Operating Temperature: 150C (Max); Price: 0.41; Type: Schottky; Device Package: SOD-123F; Voltage DC Reverse (Vr): 60V; Current Rectified: 2A
footprint SOD123F
pins: 1, 2

## RB068L-60TE25
designator D?
DIODE SCHOTTKY 60V 2A PMDU; Manufacturer: Rohm Semiconductor; Current Reverse Leakage @ Vr: 2uA @ 60V; Voltage Forward (Vf): 700mV @ 2A; Part Number: RB068L-60TE25; PartId: 29327; Supplier 1: Digi-Key; Supplier Part Number 1: RB068L-60TE25CT-ND; ComponentLink1Description: Datasheet; ComponentLink1URL: http://rohmfs.rohm.com/en/products/databook/datasheet/discrete/diode/schottky_barrier/rb068l-60.pdf; ComponentLink2Description: Digi-Key Listing; ComponentLink2URL: https://www.digikey.com/product-detail/en/rohm-semiconductor/RB068L-60TE25/RB068L-60TE25CT-ND/5813358; Junction Operating Temperature: 150C (Max); Price: 0.43; Type: Schottky; Device Package: SOD-123F; Voltage DC Reverse (Vr): 60V; Current Rectified: 2A
footprint SOD123F
pins: 1, 2

## RB068MM-40TR
designator D?
DIODE SCHOTTKY 40V 2A PMDU; Manufacturer: Rohm Semiconductor; Current Reverse Leakage @ Vr: 550nA @ 40V; Voltage Forward (Vf): 725mV @ 2A; Part Number: RB068MM-40TR; PartId: 29313; Supplier 1: Digi-Key; Supplier Part Number 1: RB068MM-40CT-ND; ComponentLink1Description: Datasheet; ComponentLink1URL: http://rohmfs.rohm.com/en/products/databook/datasheet/discrete/diode/schottky_barrier/rb068mm-40.pdf; ComponentLink2Description: Digi-Key Listing; ComponentLink2URL: https://www.digikey.com/product-detail/en/rohm-semiconductor/RB068MM-40TR/RB068MM-40CT-ND/5813361; Junction Operating Temperature: 150C (Max); Price: 0.55; Type: Schottky; Device Package: SOD-123F; Voltage DC Reverse (Vr): 40V; Current Rectified: 2A
footprint SOD123F
pins: 1, 2

## RB068MM-60TR
designator D?
DIODE SCHOTTKY 60V 2A PMDU; Manufacturer: Rohm Semiconductor; Current Reverse Leakage @ Vr: 1.5uA @ 60V; Voltage Forward (Vf): 765mV @ 2A; Part Number: RB068MM-60TR; PartId: 29312; Supplier 1: Digi-Key; Supplier Part Number 1: RB068MM-60CT-ND; ComponentLink1Description: Datasheet; ComponentLink1URL: http://rohmfs.rohm.com/en/products/databook/datasheet/discrete/diode/schottky_barrier/rb068mm-60.pdf; ComponentLink2Description: Digi-Key Listing; ComponentLink2URL: https://www.digikey.com/product-detail/en/rohm-semiconductor/RB068MM-60TR/RB068MM-60CT-ND/5813362; Junction Operating Temperature: 150C (Max); Price: 0.55; Type: Schottky; Device Package: SOD-123F; Voltage DC Reverse (Vr): 60V; Current Rectified: 2A
footprint SOD123F
pins: 1, 2

## RB070MM-30TR
designator D?
DIODE SCHOTTKY 30V 1.5A PMDU; Manufacturer: Rohm Semiconductor; Current Reverse Leakage @ Vr: 50uA @ 30V; Voltage Forward (Vf): 490mV @ 1.5A; Part Number: RB070MM-30TR; PartId: 29228; Supplier 1: Digi-Key; Supplier Part Number 1: RB070MM-30CT-ND; ComponentLink1Description: Datasheet; ComponentLink1URL: http://rohmfs.rohm.com/en/products/databook/datasheet/discrete/diode/schottky_barrier/rb070mm-30.pdf; ComponentLink2Description: Digi-Key Listing; ComponentLink2URL: https://www.digikey.com/product-detail/en/rohm-semiconductor/RB070MM-30TR/RB070MM-30CT-ND/5001876; Junction Operating Temperature: 150C (Max); Price: 0.41; Type: Schottky; Device Package: SOD-123F; Voltage DC Reverse (Vr): 30V; Current Rectified: 1.5A
footprint SOD123F
pins: 1, 2

## RB160MM-40TR
designator D?
DIODE SCHOTTKY 40V 1A PMDU; Manufacturer: Rohm Semiconductor; Current Reverse Leakage @ Vr: 30uA @ 40V; Voltage Forward (Vf): 510mV @ 1A; Part Number: RB160MM-40TR; PartId: 29295; Supplier 1: Digi-Key; Supplier Part Number 1: RB160MM-40CT-ND; ComponentLink1Description: Datasheet; ComponentLink1URL: http://rohmfs.rohm.com/en/products/databook/datasheet/discrete/diode/schottky_barrier/rb160mm-40.pdf; ComponentLink2Description: Digi-Key Listing; ComponentLink2URL: https://www.digikey.com/product-detail/en/rohm-semiconductor/RB160MM-40TR/RB160MM-40CT-ND/5001878; Junction Operating Temperature: 150C (Max); Price: 0.49; Type: Schottky; Device Package: SOD-123F; Voltage DC Reverse (Vr): 40V; Current Rectified: 1A
footprint SOD123F
pins: 1, 2

## RB160MM-50TR
designator D?
DIODE SCHOTTKY 40V 1A PMDU; Manufacturer: Rohm Semiconductor; Current Reverse Leakage @ Vr: 30uA @ 40V; Voltage Forward (Vf): 510mV @ 1A; Part Number: RB160MM-50TR; PartId: 29283; Supplier 1: Digi-Key; Supplier Part Number 1: RB160MM-50CT-ND; ComponentLink1Description: Datasheet; ComponentLink1URL: http://rohmfs.rohm.com/en/products/databook/datasheet/discrete/diode/schottky_barrier/rb160mm-50.pdf; ComponentLink2Description: Digi-Key Listing; ComponentLink2URL: https://www.digikey.com/product-detail/en/rohm-semiconductor/RB160MM-50TR/RB160MM-50CT-ND/5001879; Junction Operating Temperature: 150C (Max); Price: 0.43; Type: Schottky; Device Package: SOD-123F; Voltage DC Reverse (Vr): 40V; Current Rectified: 1A
footprint SOD123F
pins: 1, 2

## RB160MM-60TR
designator D?
DIODE SCHOTTKY 60V 1A PMDU; Manufacturer: Rohm Semiconductor; Current Reverse Leakage @ Vr: 50uA @ 60V; Voltage Forward (Vf): 550mV @ 1A; Part Number: RB160MM-60TR; PartId: 29192; Supplier 1: Digi-Key; Supplier Part Number 1: RB160MM-60CT-ND; ComponentLink1Description: Datasheet; ComponentLink1URL: http://rohmfs.rohm.com/en/products/databook/datasheet/discrete/diode/schottky_barrier/rb160mm-60.pdf; ComponentLink2Description: Digi-Key Listing; ComponentLink2URL: https://www.digikey.com/product-detail/en/rohm-semiconductor/RB160MM-60TR/RB160MM-60CT-ND/5001880; Junction Operating Temperature: 150C (Max); Price: 0.49; Type: Schottky; Device Package: SOD-123F; Voltage DC Reverse (Vr): 60V; Current Rectified: 1A
footprint SOD123F
pins: 1, 2

## RB160MM-90TR
designator D?
DIODE SCHOTTKY 90V 1A PMDU; Manufacturer: Rohm Semiconductor; Current Reverse Leakage @ Vr: 100uA @ 90V; Voltage Forward (Vf): 730mV @ 1A; Part Number: RB160MM-90TR; PartId: 29239; Supplier 1: Digi-Key; Supplier Part Number 1: RB160MM-90TRCT-ND; ComponentLink1Description: Datasheet; ComponentLink1URL: http://rohmfs.rohm.com/en/products/databook/datasheet/discrete/diode/schottky_barrier/rb160mm-90.pdf; ComponentLink2Description: Digi-Key Listing; ComponentLink2URL: https://www.digikey.com/product-detail/en/rohm-semiconductor/RB160MM-90TR/RB160MM-90TRCT-ND/5720306; Junction Operating Temperature: 150C (Max); Price: 0.55; Type: Schottky; Device Package: SOD-123F; Voltage DC Reverse (Vr): 90V; Current Rectified: 1A
footprint SOD123F
pins: 1, 2

## RB161MM-20TR
designator D?
DIODE SCHOTTKY 25V 1A PMDU; Manufacturer: Rohm Semiconductor; Current Reverse Leakage @ Vr: 700uA @ 20V; Voltage Forward (Vf): 350mV @ 1A; Part Number: RB161MM-20TR; PartId: 29196; Supplier 1: Digi-Key; Supplier Part Number 1: RB161MM-20CT-ND; ComponentLink1Description: Datasheet; ComponentLink1URL: http://rohmfs.rohm.com/en/products/databook/datasheet/discrete/diode/schottky_barrier/rb161mm-20.pdf; ComponentLink2Description: Digi-Key Listing; ComponentLink2URL: https://www.digikey.com/product-detail/en/rohm-semiconductor/RB161MM-20TR/RB161MM-20CT-ND/5001881; Junction Operating Temperature: 125C (Max); Price: 0.53; Type: Schottky; Device Package: SOD-123F; Voltage DC Reverse (Vr): 25V; Current Rectified: 1A
footprint SOD123F
pins: 1, 2

## RB162MM-30TR
designator D?
DIODE SCHOTTKY 30V 1A PMDU; Manufacturer: Rohm Semiconductor; Current Reverse Leakage @ Vr: 100uA @ 30V; Voltage Forward (Vf): 520mV @ 1A; Part Number: RB162MM-30TR; PartId: 29314; Supplier 1: Digi-Key; Supplier Part Number 1: RB162MM-30CT-ND; ComponentLink1Description: Datasheet; ComponentLink1URL: http://rohmfs.rohm.com/en/products/databook/datasheet/discrete/diode/schottky_barrier/rb162mm-30.pdf; ComponentLink2Description: Digi-Key Listing; ComponentLink2URL: https://www.digikey.com/product-detail/en/rohm-semiconductor/RB162MM-30TR/RB162MM-30CT-ND/5720307; Junction Operating Temperature: 150C (Max); Price: 0.56; Type: Schottky; Device Package: SOD-123F; Voltage DC Reverse (Vr): 30V; Current Rectified: 1A
footprint SOD123F
pins: 1, 2

## RB162MM-40TR
designator D?
DIODE SCHOTTKY 40V 1A PMDU; Manufacturer: Rohm Semiconductor; Current Reverse Leakage @ Vr: 100uA @ 40V; Voltage Forward (Vf): 550mV @ 1A; Part Number: RB162MM-40TR; PartId: 29257; Supplier 1: Digi-Key; Supplier Part Number 1: RB162MM-40CT-ND; ComponentLink1Description: Datasheet; ComponentLink1URL: http://rohmfs.rohm.com/en/products/databook/datasheet/discrete/diode/schottky_barrier/rb162mm-40.pdf; ComponentLink2Description: Digi-Key Listing; ComponentLink2URL: https://www.digikey.com/product-detail/en/rohm-semiconductor/RB162MM-40TR/RB162MM-40CT-ND/5001882; Junction Operating Temperature: 150C (Max); Price: 0.35; Type: Schottky; Device Package: SOD-123F; Voltage DC Reverse (Vr): 40V; Current Rectified: 1A
footprint SOD123F
pins: 1, 2

## RB162MM-60TR
designator D?
DIODE SCHOTTKY 60V 1A PMDU; Manufacturer: Rohm Semiconductor; Current Reverse Leakage @ Vr: 100uA @ 60V; Voltage Forward (Vf): 650mV @ 1A; Part Number: RB162MM-60TR; PartId: 29262; Supplier 1: Digi-Key; Supplier Part Number 1: RB162MM-60CT-ND; ComponentLink1Description: Datasheet; ComponentLink1URL: http://rohmfs.rohm.com/en/products/databook/datasheet/discrete/diode/schottky_barrier/rb162mm-60.pdf; ComponentLink2Description: Digi-Key Listing; ComponentLink2URL: https://www.digikey.com/product-detail/en/rohm-semiconductor/RB162MM-60TR/RB162MM-60CT-ND/5001883; Junction Operating Temperature: 150C (Max); Price: 0.37; Type: Schottky; Device Package: SOD-123F; Voltage DC Reverse (Vr): 60V; Current Rectified: 1A
footprint SOD123F
pins: 1, 2

## RB168MM100TR
designator D?
DIODE SCHOTTKY 100V 1A SOD123FL; Manufacturer: Rohm Semiconductor; Current Reverse Leakage @ Vr: 400nA @ 100V; Voltage Forward (Vf): 810mV @ 1A; Part Number: RB168MM100TR; PartId: 29202; Supplier 1: Digi-Key; Supplier Part Number 1: RB168MM100CT-ND; ComponentLink1Description: Datasheet; ComponentLink1URL: http://rohmfs.rohm.com/en/products/databook/datasheet/discrete/diode/schottky_barrier/rb168mm100.pdf; ComponentLink2Description: Digi-Key Listing; ComponentLink2URL: https://www.digikey.com/product-detail/en/rohm-semiconductor/RB168MM100TR/RB168MM100CT-ND/5722695; Junction Operating Temperature: 150C (Max); Price: 0.49; Type: Schottky; Device Package: SOD-123F; Voltage DC Reverse (Vr): 100V; Current Rectified: 1A
footprint SOD123F
pins: 1, 2